# Altium footprint library Tomra_Cadstar_Footprints.PcbLib: 380 footprints (part 6 of 24)
Each footprint in its own frame and in the unit in brackets; x right, y up, seen from the top. Pads: shape width x height; smd on the part's side, far side on the other; paste and mask are expansions set on the pad; w line width, h text height; cw(c..) or ccw(c..) is an arc to the next point about the centre after c.
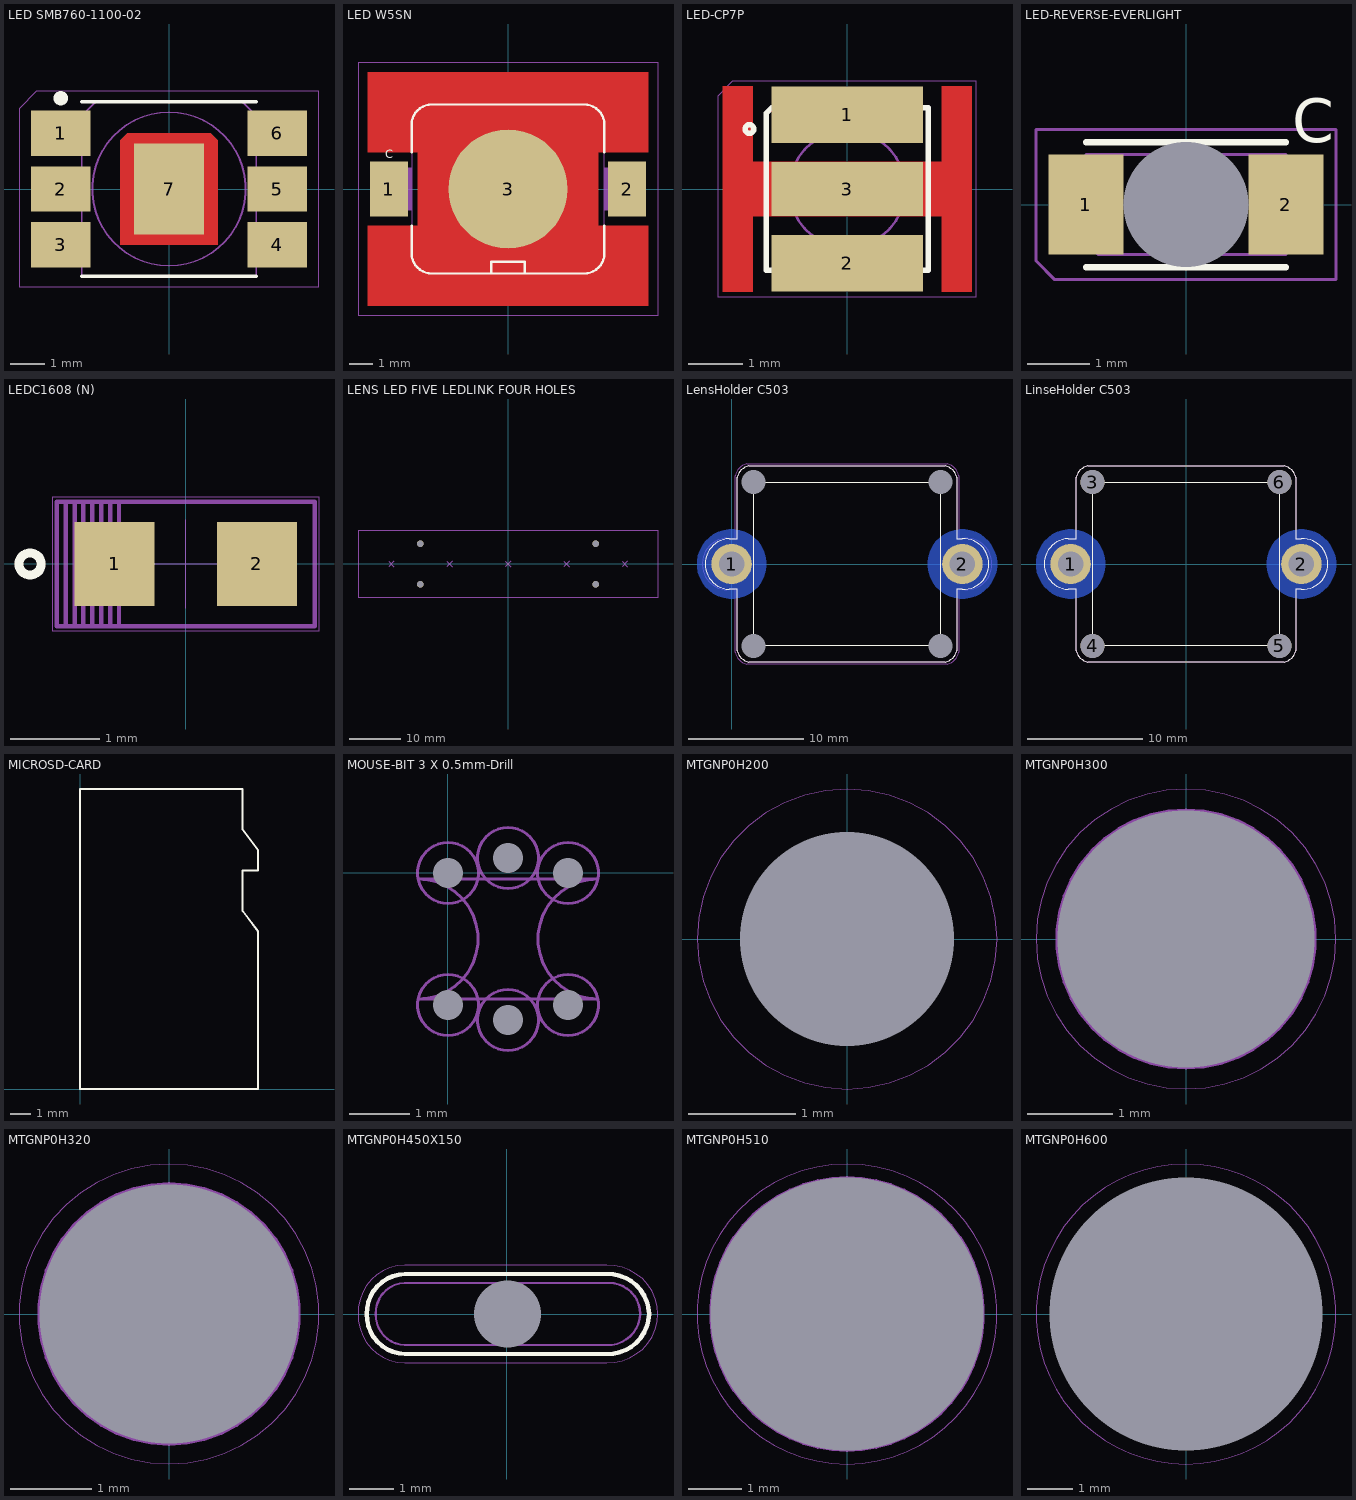
[diagram p5: the footprints below, top view; thin cyan lines are the x and y axes]

## LED SMB760-1100-02 [mm]
height 7.5
pads (7):
  rect 1.7x1.3 smd paste+0 mask+0: 1(-3.1,1.6) 2(-3.1,0) 3(-3.1,-1.6) 4(3.1,-1.6) 5(3.1,0) 6(3.1,1.6)
  rect 2x2.6 smd paste+0 mask+0: 7(0,0)
Top Elec:
  region: 1.4,-1.6 1.4,1.4 1.2,1.6 -1.2,1.6 -1.4,1.4 -1.4,-1.6
Top Silk:
  region: -3.1,2.4 -3.14,2.4 -3.213,2.43 -3.27,2.487 -3.3,2.56 -3.3,2.64 -3.27,2.713 -3.213,2.77 -3.14,2.8 -3.1,2.8 -3.06,2.8 -2.987,2.77 -2.93,2.713 -2.9,2.64 -2.9,2.56 -2.93,2.487 -2.987,2.43 -3.06,2.4
  lines w0.1: -2.5,-2.5 2.5,-2.5 ; -2.5,2.5 2.5,2.5
  text ".Designator" at -2.5,2.5 h0.7
Top Paste:
  region: 1.4,-1.6 1.4,1.4 1.2,1.6 -1.2,1.6 -1.4,1.4 -1.4,-1.6
Top Solder Resist:
  region: 1.4,-1.6 1.4,1.4 1.2,1.6 -1.2,1.6 -1.4,1.4 -1.4,-1.6
Drill:
  lines w0.05: 0,-0.7 cw(c0,0) 0,0.7 cw(c0,0) 0,-0.7
Top Assembly:
  region: -3.7,1.2 -2.5,1.2 -2.5,2 -3.7,2
  region: 2.5,1.2 3.7,1.2 3.7,2 2.5,2
  region: -3.7,-0.4 -2.5,-0.4 -2.5,0.4 -3.7,0.4
  region: 2.5,-0.4 3.7,-0.4 3.7,0.4 2.5,0.4
  region: -3.7,-2 -2.5,-2 -2.5,-1.2 -3.7,-1.2
  region: 2.5,-2 3.7,-2 3.7,-1.2 2.5,-1.2
  lines w0.05: -2.5,-2.5 2.5,-2.5 2.5,2.1 2.1,2.5 -2.1,2.5 -2.5,2.1 -2.5,-2.5 ; 0,-2.2 cw(c0,0) 0,2.2 cw(c0,0) 0,-2.2
Top Placement:
  lines w0.01: -4.3,-2.8 4.3,-2.8 4.3,2.8 -3.8,2.8 -4.3,2.3 -4.3,-2.8

## LED W5SN [mm]
pads (3):
  rrect0% 1.6x2.3 smd paste+0 mask+0: 1(-5,0) 2(5,0)
  round 5 smd paste-2.5 mask-2.5: 3(0,0)
Top Elec:
  region: -5.9,4.9 5.9,4.9 5.9,1.55 3.8,1.55 3.8,-1.55 5.9,-1.55 5.9,-4.9 -5.9,-4.9 -5.9,-1.55 -3.8,-1.55 -3.8,1.55 -5.9,1.55
Top Silk:
  lines w0.1: -4.05,-1.55 -4.05,-2.7 ccw(c-3.2,-2.7) -3.2,-3.55 3.2,-3.55 ccw(c3.2,-2.7) 4.05,-2.7 4.05,-1.55 ; -4.05,1.55 -4.05,2.7 cw(c-3.2,2.7) -3.2,3.55 3.2,3.55 cw(c3.2,2.7) 4.05,2.7 4.05,1.55 ; -0.7,-3.55 0.7,-3.55 0.7,-3.05 -0.7,-3.05 -0.7,-3.55 ; 0,-2 cw(c0,0) 0,2 cw(c0,0) 0,-2 ; 0,-1.35 cw(c0,0) 0,1.35 cw(c0,0) 0,-1.35
  text "C" at -5.15,1.3 h0.35
  text ".Designator" at -3.09,2.51 h0.7
Top Paste:
  region: 0,-1.15 -0.151,-1.15 -0.444,-1.072 -0.706,-0.92 -0.92,-0.706 -1.072,-0.444 -1.15,-0.151 -1.15,0.151 -1.072,0.444 -0.92,0.706 -0.706,0.92 -0.444,1.072 -0.151,1.15 0,1.15 0.151,1.15 0.444,1.072 0.706,0.92 0.92,0.706 1.072,0.444 1.15,0.151 1.15,-0.151 1.072,-0.444 0.92,-0.706 0.706,-0.92 0.444,-1.072 0.151,-1.15
Top Assembly:
  region: 0,-1.6 -0.158,-1.6 -0.467,-1.539 -0.758,-1.418 -1.02,-1.243 -1.243,-1.02 -1.418,-0.758 -1.539,-0.467 -1.6,-0.158 -1.6,0.158 -1.539,0.467 -1.418,0.758 -1.243,1.02 -1.02,1.243 -0.758,1.418 -0.467,1.539 -0.158,1.6 0,1.6 0.158,1.6 0.467,1.539 0.758,1.418 1.02,1.243 1.243,1.02 1.418,0.758 1.539,0.467 1.6,0.158 1.6,-0.158 1.539,-0.467 1.418,-0.758 1.243,-1.02 1.02,-1.243 0.758,-1.418 0.467,-1.539 0.158,-1.6
  region: 4.05,0.9 5.55,0.9 5.55,-0.9 4.05,-0.9
  region: -5.55,0.9 -4.05,0.9 -4.05,-0.9 -5.55,-0.9
  lines w0.05: -4.05,-2.7 ccw(c-3.2,-2.7) -3.2,-3.55 3.2,-3.55 ccw(c3.2,-2.7) 4.05,-2.7 4.05,2.7 ccw(c3.2,2.7) 3.2,3.55 -3.2,3.55 ccw(c-3.2,2.7) -4.05,2.7 -4.05,-2.7 ; -0.7,-3.55 0.7,-3.55 0.7,-3.05 -0.7,-3.05 -0.7,-3.55
  text "Catode" at -2.05,-2.7 h0.35
Top Placement:
  lines w0.01: -6.3,-5.3 6.3,-5.3 6.3,5.3 -6.3,5.3 -6.3,-5.3

## LED-CP7P [mm]
height 2
pads (3):
  rect 2.8x1.05 smd paste+0 mask+0: 1(0.001,1.375) 2(0,-1.374)
  rect 2.8x1 smd paste+0 mask+0: 3(0,0)
Top Elec:
  region: 2.3,1.9 2.3,-1.9 1.75,-1.9 1.75,-0.5 -1.75,-0.5 -1.75,-1.9 -2.3,-1.9 -2.3,1.9 -1.75,1.9 -1.75,0.5 1.75,0.5 1.75,1.9
Top Silk:
  lines w0.1: -1.81,1.03 cw(c-1.81,1.11) -1.81,1.19 cw(c-1.81,1.11) -1.81,1.03 ; -1.5,-1.5 1.5,-1.5 1.5,1.5 -1.4,1.5 -1.5,1.4 -1.5,-1.5
  text ".Designator" at -2.13,1.99 h0.7
Top Assembly:
  lines w0.05: -1.5,-1.5 1.5,-1.5 1.5,1.5 -1.4,1.5 -1.5,1.4 -1.5,-1.5 ; 0,-1.075 cw(c0,0) 0,1.075 cw(c0,0) 0,-1.075
Top Placement:
  lines w0.01: -2.4,-1.99 2.39,-1.99 2.39,1.99 -2.13,1.99 -2.4,1.72 -2.4,-1.99

## LED-REVERSE-EVERLIGHT [mm]
height 1.1
pads (3):
  rect 1.2x1.6 smd paste+0 mask+0: 1(-1.6,0) 2(1.6,0)
  round 0 / inner round 1.524 / far side round 0 hole 2 unplated paste+0 mask+2: 3(0,0)
Top Silk:
  lines w0.1: -1.6,-1 1.6,-1 ; -1.6,1 1.6,1
  text "C" at 1.7,1 h0.7
  text ".Designator" at -2.3,1.4 h0.7
Top Assembly:
  region: 1.025,-0.8 1.2,-0.8 1.2,0.775 1.025,0.775
  lines w0.05: -1.6,-0.6 -1.4,-0.8 1.6,-0.8 1.6,0.8 -1.6,0.8 -1.6,-0.6
Top Placement:
  region: -1.225,-0.8 -1.05,-0.8 -1.05,0.775 -1.225,0.775
  lines w0.05: -2.4,-0.9 -2.1,-1.2 2.4,-1.2 2.4,1.2 -2.4,1.2 -2.4,-0.9

## LEDC1608 (N) [mm]
height 0.8
pads (2):
  rect 0.9x0.95 smd paste+0 mask+0: 1(-0.8,0) 2(0.8,0)
Top Silk:
  lines w0.1: -1.875,0 cw(c-1.75,0) -1.625,0 cw(c-1.75,0) -1.875,0
  text ".Designator" at -3.599,-0.35 h0.7
Top Assembly:
  lines w0.05: -1.35,-0.7 -1.35,0.7 ; -1.25,-0.7 -1.25,0.7 ; -1.15,-0.7 -1.15,0.7 ; -1.05,-0.7 -1.05,0.7 ; -0.95,-0.7 -0.95,0.7 ; -0.85,-0.7 -0.85,0.7 ; -0.75,-0.7 -0.75,0.7 ; -1.45,-0.7 1.45,-0.7 1.45,0.7 -1.45,0.7 ; -1.45,-0.7 -1.45,0.7 ; -1.45,-0.7 -1.45,0.7
Top Placement:
  lines w0.01: -0.5,0 0.5,0 ; 0,-0.5 0,0.5 ; -1.5,-0.75 1.5,-0.75 1.5,0.75 -1.5,0.75 -1.5,-0.75

## LENS LED FIVE LEDLINK FOUR HOLES [mm]
height 10
pads (4):
  round 1.295 / inner round 1.524 / far side round 1.397 hole 1.3 unplated paste+0: 1(-17.25,4) 2(-17.25,-4) 3(17.25,4) 4(17.25,-4)
Top Placement:
  lines w0.01: -23.5,-0.5 -22.5,0.5 ; -23.5,0.5 -22.5,-0.5 ; -12,-0.5 -11,0.5 ; -12,0.5 -11,-0.5 ; -0.5,-0.5 0.5,0.5 ; -0.5,0.5 0.5,-0.5 ; 11,-0.5 12,0.5 ; 11,0.5 12,-0.5 ; 22.5,-0.5 23.5,0.5 ; 22.5,0.5 23.5,-0.5 ; -29.5,-6.5 29.5,-6.5 29.5,6.5 -29.5,6.5 -29.5,-6.5

## LensHolder C503 [mm]
height 15
pads (6):
  round 3.5 / inner round 1.524 / far side round 3.5 hole 2.2 paste+0 mask+0: 1(0,0) 2(20,0)
  round 0 / inner round 1.524 / far side round 0 hole 2.1 unplated paste+0 mask+0: 3(1.9,7.1) 4(1.9,-7.1) 5(18.1,-7.1) 6(18.1,7.1)
Bottom Elec:
  region: 20,-3 19.764,-3 19.297,-2.926 18.848,-2.78 18.428,-2.566 18.046,-2.288 17.712,-1.954 17.434,-1.572 17.22,-1.152 17.074,-0.703 17,-0.236 17,0.236 17.074,0.703 17.22,1.152 17.434,1.572 17.712,1.954 18.046,2.288 18.428,2.566 18.848,2.78 19.297,2.926 19.764,3 20,3 20.236,3 20.703,2.926 21.152,2.78 21.572,2.566 21.954,2.288 22.288,1.954 22.566,1.572 22.78,1.152 22.926,0.703 23,0.236 23,-0.236 22.926,-0.703 22.78,-1.152 22.566,-1.572 22.288,-1.954 21.954,-2.288 21.572,-2.566 21.152,-2.78 20.703,-2.926 20.236,-3
  region: 0,-3 -0.236,-3 -0.703,-2.926 -1.152,-2.78 -1.572,-2.566 -1.954,-2.288 -2.288,-1.954 -2.566,-1.572 -2.78,-1.152 -2.926,-0.703 -3,-0.236 -3,0.236 -2.926,0.703 -2.78,1.152 -2.566,1.572 -2.288,1.954 -1.954,2.288 -1.572,2.566 -1.152,2.78 -0.703,2.926 -0.236,3 0,3 0.236,3 0.703,2.926 1.152,2.78 1.572,2.566 1.954,2.288 2.288,1.954 2.566,1.572 2.78,1.152 2.926,0.703 3,0.236 3,-0.236 2.926,-0.703 2.78,-1.152 2.566,-1.572 2.288,-1.954 1.954,-2.288 1.572,-2.566 1.152,-2.78 0.703,-2.926 0.236,-3
Top Silk:
  lines w0.1: -0.2,-2.2 0.5,-2.2 0.5,-7.5 ccw(c1.75,-7.25) 1.5,-8.5 18.5,-8.5 ccw(c18.25,-7.25) 19.5,-7.5 19.5,-2.2 20,-2.2 ccw(c20.098,0) 20,2.2 19.5,2.2 19.5,7.5 ccw(c18.25,7.25) 18.5,8.5 1.5,8.5 ccw(c1.75,7.25) 0.5,7.5 0.5,2.2 -0.2,2.2 ccw(c-0.098,0) -0.2,-2.2 ; 1.9,-7.1 18.1,-7.1 18.1,7.1 1.9,7.1 1.9,-7.1
  text ".Designator" at 1.5,8.5 h0.7
Bottom Solder Resist:
  region: 0,-3 -0.236,-3 -0.703,-2.926 -1.152,-2.78 -1.572,-2.566 -1.954,-2.288 -2.288,-1.954 -2.566,-1.572 -2.78,-1.152 -2.926,-0.703 -3,-0.236 -3,0.236 -2.926,0.703 -2.78,1.152 -2.566,1.572 -2.288,1.954 -1.954,2.288 -1.572,2.566 -1.152,2.78 -0.703,2.926 -0.236,3 0,3 0.236,3 0.703,2.926 1.152,2.78 1.572,2.566 1.954,2.288 2.288,1.954 2.566,1.572 2.78,1.152 2.926,0.703 3,0.236 3,-0.236 2.926,-0.703 2.78,-1.152 2.566,-1.572 2.288,-1.954 1.954,-2.288 1.572,-2.566 1.152,-2.78 0.703,-2.926 0.236,-3
  region: 20,-3 19.764,-3 19.297,-2.926 18.848,-2.78 18.428,-2.566 18.046,-2.288 17.712,-1.954 17.434,-1.572 17.22,-1.152 17.074,-0.703 17,-0.236 17,0.236 17.074,0.703 17.22,1.152 17.434,1.572 17.712,1.954 18.046,2.288 18.428,2.566 18.848,2.78 19.297,2.926 19.764,3 20,3 20.236,3 20.703,2.926 21.152,2.78 21.572,2.566 21.954,2.288 22.288,1.954 22.566,1.572 22.78,1.152 22.926,0.703 23,0.236 23,-0.236 22.926,-0.703 22.78,-1.152 22.566,-1.572 22.288,-1.954 21.954,-2.288 21.572,-2.566 21.152,-2.78 20.703,-2.926 20.236,-3
Top Assembly:
  lines w0.05: -0.2,-2.2 0.5,-2.2 0.5,-7.5 ccw(c1.75,-7.25) 1.5,-8.5 18.5,-8.5 ccw(c18.25,-7.25) 19.5,-7.5 19.5,-2.2 20,-2.2 ccw(c20.098,0) 20,2.2 19.5,2.2 19.5,7.5 ccw(c18.25,7.25) 18.5,8.5 1.5,8.5 ccw(c1.75,7.25) 0.5,7.5 0.5,2.2 -0.2,2.2 ccw(c-0.098,0) -0.2,-2.2 ; 1.9,-7.1 18.1,-7.1 18.1,7.1 1.9,7.1 1.9,-7.1
Top Placement:
  lines w0.01: -0.407,-2.245 0.307,-2.245 0.307,-7.653 ccw(c1.582,-7.398) 1.327,-8.673 18.673,-8.673 ccw(c18.418,-7.398) 19.693,-7.653 19.693,-2.245 20.203,-2.245 ccw(c20.303,0) 20.203,2.245 19.693,2.245 19.693,7.653 ccw(c18.418,7.398) 18.673,8.673 1.327,8.673 ccw(c1.582,7.398) 0.307,7.653 0.307,2.245 -0.407,2.245 ccw(c-0.303,0) -0.407,-2.245

## LinseHolder C503 [mm]
height 15
pads (6):
  round 3.5 / inner round 1.524 / far side round 3.5 hole 2.2 paste+0 mask+0.1: 1(-10,0) 2(10,0)
  round 2.083 / inner round 1.524 / far side round 2.083 hole 2.1 unplated: 3(-8.1,7.1) 4(-8.1,-7.1) 5(8.1,-7.1) 6(8.1,7.1)
Bottom Elec:
  region: -10,-3 -10.236,-3 -10.703,-2.926 -11.152,-2.78 -11.572,-2.566 -11.954,-2.288 -12.288,-1.954 -12.566,-1.572 -12.78,-1.152 -12.926,-0.703 -13,-0.236 -13,0.236 -12.926,0.703 -12.78,1.152 -12.566,1.572 -12.288,1.954 -11.954,2.288 -11.572,2.566 -11.152,2.78 -10.703,2.926 -10.236,3 -10,3 -9.764,3 -9.297,2.926 -8.848,2.78 -8.428,2.566 -8.046,2.288 -7.712,1.954 -7.434,1.572 -7.22,1.152 -7.074,0.703 -7,0.236 -7,-0.236 -7.074,-0.703 -7.22,-1.152 -7.434,-1.572 -7.712,-1.954 -8.046,-2.288 -8.428,-2.566 -8.848,-2.78 -9.297,-2.926 -9.764,-3
  region: 10,-3 9.764,-3 9.297,-2.926 8.848,-2.78 8.428,-2.566 8.046,-2.288 7.712,-1.954 7.434,-1.572 7.22,-1.152 7.074,-0.703 7,-0.236 7,0.236 7.074,0.703 7.22,1.152 7.434,1.572 7.712,1.954 8.046,2.288 8.428,2.566 8.848,2.78 9.297,2.926 9.764,3 10,3 10.236,3 10.703,2.926 11.152,2.78 11.572,2.566 11.954,2.288 12.288,1.954 12.566,1.572 12.78,1.152 12.926,0.703 13,0.236 13,-0.236 12.926,-0.703 12.78,-1.152 12.566,-1.572 12.288,-1.954 11.954,-2.288 11.572,-2.566 11.152,-2.78 10.703,-2.926 10.236,-3
Top Silk:
  lines w0.1: -10.2,-2.2 -9.5,-2.2 -9.5,-7.5 ccw(c-8.25,-7.25) -8.5,-8.5 8.5,-8.5 ccw(c8.25,-7.25) 9.5,-7.5 9.5,-2.2 10,-2.2 ccw(c10.098,0) 10,2.2 9.5,2.2 9.5,7.5 ccw(c8.25,7.25) 8.5,8.5 -8.5,8.5 ccw(c-8.25,7.25) -9.5,7.5 -9.5,2.2 -10.2,2.2 ccw(c-10.098,0) -10.2,-2.2 ; -8.1,-7.1 8.1,-7.1 8.1,7.1 -8.1,7.1 -8.1,-7.1
  text ".Comment" at -2.5,2 h1.07
  text ".Designator" at -2.5,2 h1.07
Bottom Solder Resist:
  region: -10,-3 -10.236,-3 -10.703,-2.926 -11.152,-2.78 -11.572,-2.566 -11.954,-2.288 -12.288,-1.954 -12.566,-1.572 -12.78,-1.152 -12.926,-0.703 -13,-0.236 -13,0.236 -12.926,0.703 -12.78,1.152 -12.566,1.572 -12.288,1.954 -11.954,2.288 -11.572,2.566 -11.152,2.78 -10.703,2.926 -10.236,3 -10,3 -9.764,3 -9.297,2.926 -8.848,2.78 -8.428,2.566 -8.046,2.288 -7.712,1.954 -7.434,1.572 -7.22,1.152 -7.074,0.703 -7,0.236 -7,-0.236 -7.074,-0.703 -7.22,-1.152 -7.434,-1.572 -7.712,-1.954 -8.046,-2.288 -8.428,-2.566 -8.848,-2.78 -9.297,-2.926 -9.764,-3
  region: 10,-3 9.764,-3 9.297,-2.926 8.848,-2.78 8.428,-2.566 8.046,-2.288 7.712,-1.954 7.434,-1.572 7.22,-1.152 7.074,-0.703 7,-0.236 7,0.236 7.074,0.703 7.22,1.152 7.434,1.572 7.712,1.954 8.046,2.288 8.428,2.566 8.848,2.78 9.297,2.926 9.764,3 10,3 10.236,3 10.703,2.926 11.152,2.78 11.572,2.566 11.954,2.288 12.288,1.954 12.566,1.572 12.78,1.152 12.926,0.703 13,0.236 13,-0.236 12.926,-0.703 12.78,-1.152 12.566,-1.572 12.288,-1.954 11.954,-2.288 11.572,-2.566 11.152,-2.78 10.703,-2.926 10.236,-3
Top Assembly:
  lines w0.05: -10.2,-2.2 -9.5,-2.2 -9.5,-7.5 ccw(c-8.25,-7.25) -8.5,-8.5 8.5,-8.5 ccw(c8.25,-7.25) 9.5,-7.5 9.5,-2.2 10,-2.2 ccw(c10.098,0) 10,2.2 9.5,2.2 9.5,7.5 ccw(c8.25,7.25) 8.5,8.5 -8.5,8.5 ccw(c-8.25,7.25) -9.5,7.5 -9.5,2.2 -10.2,2.2 ccw(c-10.098,0) -10.2,-2.2 ; -8.1,-7.1 8.1,-7.1 8.1,7.1 -8.1,7.1 -8.1,-7.1
Top Placement:
  lines w0.01: -10.2,-2.2 -9.5,-2.2 -9.5,-7.5 ccw(c-8.25,-7.25) -8.5,-8.5 8.5,-8.5 ccw(c8.25,-7.25) 9.5,-7.5 9.5,-2.2 10,-2.2 ccw(c10.098,0) 10,2.2 9.5,2.2 9.5,7.5 ccw(c8.25,7.25) 8.5,8.5 -8.5,8.5 ccw(c-8.25,7.25) -9.5,7.5 -9.5,2.2 -10.2,2.2 ccw(c-10.098,0) -10.2,-2.2 ; -8.1,-7.1 8.1,-7.1 8.1,7.1 -8.1,7.1 -8.1,-7.1

## MICROSD-CARD [mm]
Top Silk:
  lines w0.1: 0,0 0,14.75 8,14.75 8,12.75 8.75,11.75 8.75,10.75 8,10.75 8,8.75 8.75,7.75 8.75,0 0,0
Top Assembly:
  text ".Designator" at 0.35,15.01 h0.7

## MOUSE-BIT 3 X 0.5mm-Drill [mm]
pads (6):
  round 0 / inner round 1.524 / far side round 0 hole 0.5 unplated paste+0 mask+0: 1(0,0) 2(1,0.25) 3(2,0) 4(0,-2.2) 5(1,-2.45) 6(2,-2.2)
Drill:
  lines w0.05: -0.5,-2.1 2.5,-2.1 cw(c2.5,-1.1) 2.5,-0.1 -0.5,-0.1 cw(c-0.5,-1.1) -0.5,-2.1
Top Assembly:
  lines w0.05: 0,-2.708 cw(c0,-2.2) 0,-1.692 cw(c0,-2.2) 0,-2.708 ; 0,-0.508 cw(c0,0) 0,0.508 cw(c0,0) 0,-0.508 ; 1,-2.958 cw(c1,-2.45) 1,-1.942 cw(c1,-2.45) 1,-2.958 ; 1,-0.258 cw(c1,0.25) 1,0.758 cw(c1,0.25) 1,-0.258 ; 2,-2.708 cw(c2,-2.2) 2,-1.692 cw(c2,-2.2) 2,-2.708 ; 2,-0.508 cw(c2,0) 2,0.508 cw(c2,0) 2,-0.508
  text ".Designator" at 1,-1.05 h0.7
Top Placement:
  lines w0.01: 0,-2.708 cw(c0,-2.2) 0,-1.692 cw(c0,-2.2) 0,-2.708 ; 0,-0.508 cw(c0,0) 0,0.508 cw(c0,0) 0,-0.508 ; 1,-2.958 cw(c1,-2.45) 1,-1.942 cw(c1,-2.45) 1,-2.958 ; 1,-0.258 cw(c1,0.25) 1,0.758 cw(c1,0.25) 1,-0.258 ; 2,-2.708 cw(c2,-2.2) 2,-1.692 cw(c2,-2.2) 2,-2.708 ; 2,-0.508 cw(c2,0) 2,0.508 cw(c2,0) 2,-0.508

## MTGNP0H200 [mm]
pads (1):
  round 0 / inner round 1.524 / far side round 0 hole 2 unplated paste+0 mask+2: 1(0,0)
Top Assembly:
  text ".Designator" at 0,1.3 h0.7
Top Placement:
  lines w0.01: 0,-1.4 cw(c0,0) 0,1.4 cw(c0,0) 0,-1.4

## MTGNP0H300 [mm]
pads (1):
  round 0 / inner round 1.524 / far side round 0 hole 3 unplated paste+0 mask+0: 1(0,0)
Top Assembly:
  lines w0.05: 0,-1.5 cw(c0,0) 0,1.5 cw(c0,0) 0,-1.5
  text ".Designator" at 0,1.8 h0.7
Top Placement:
  lines w0.01: 0,-1.75 cw(c0,0) 0,1.75 cw(c0,0) 0,-1.75

## MTGNP0H320 [mm]
pads (1):
  round 0 / inner round 1.524 / far side round 0 hole 3.2 unplated paste+0 mask+0: 1(0,0)
Top Assembly:
  lines w0.05: 0,-1.6 cw(c0,0) 0,1.6 cw(c0,0) 0,-1.6
  text ".Designator" at 0,1.85 h0.7
Top Placement:
  lines w0.01: 0,-1.85 cw(c0,0) 0,1.85 cw(c0,0) 0,-1.85

## MTGNP0H450X150 [mm]
height 0.5
pads (1):
  round 0 / inner round 1.524 / far side round 0 hole 1.5 unplated paste+0 mask+0: 1(0.013,0)
Top Silk:
  lines w0.1: -3.15,0 ccw(c-2.275,-0.025) -2.3,-0.9 2.25,-0.9 ccw(c2.275,0.025) 3.2,0 ccw(c2.275,-0.025) 2.25,0.9 -2.3,0.9 ccw(c-2.275,0.025) -3.15,0
Drill:
  text ".Designator" at -2.3,1.1 h0.7
Top Assembly:
  lines w0.05: -2.95,0 ccw(c-2.275,-0.025) -2.3,-0.7 2.25,-0.7 ccw(c2.275,0.025) 3,0 ccw(c2.3,0) 2.3,0.7 -2.3,0.7 ccw(c-2.275,0.025) -2.95,0
Top Placement:
  lines w0.01: -3.35,0 ccw(c-2.275,-0.025) -2.3,-1.1 2.25,-1.1 ccw(c2.275,0.025) 3.4,0 ccw(c2.275,-0.025) 2.25,1.1 -2.3,1.1 ccw(c-2.275,0.025) -3.35,0

## MTGNP0H510 [mm]
pads (1):
  round 0 / inner round 1.524 / far side round 0 hole 5.1 unplated paste+0 mask+0: 1(0,0)
Top Assembly:
  lines w0.05: 0,-2.55 cw(c0,0) 0,2.55 cw(c0,0) 0,-2.55
  text ".Designator" at 0.025,2.8 h0.7
Top Placement:
  lines w0.01: 0,-2.8 cw(c0,0) 0,2.8 cw(c0,0) 0,-2.8

## MTGNP0H600 [mm]
pads (1):
  round 0 / inner round 1.524 / far side round 0 hole 6 unplated paste+0 mask+0: 1(0,0)
Top Assembly:
  lines w0.05: 0,-2.9 cw(c0,0) 0,2.9 cw(c0,0) 0,-2.9
  text ".Designator" at 0,3.3 h0.7
Top Placement:
  lines w0.01: 0,-3.3 cw(c0,0) 0,3.3 cw(c0,0) 0,-3.3